# Altium footprint library hphonglib.PcbLib: 703 footprints (part 1 of 44)
Each footprint in its own frame and in the unit in brackets; x right, y up, seen from the top. Pads: shape width x height; smd on the part's side, far side on the other; paste and mask are expansions set on the pad; w line width, h text height; cw(c..) or ccw(c..) is an arc to the next point about the centre after c.
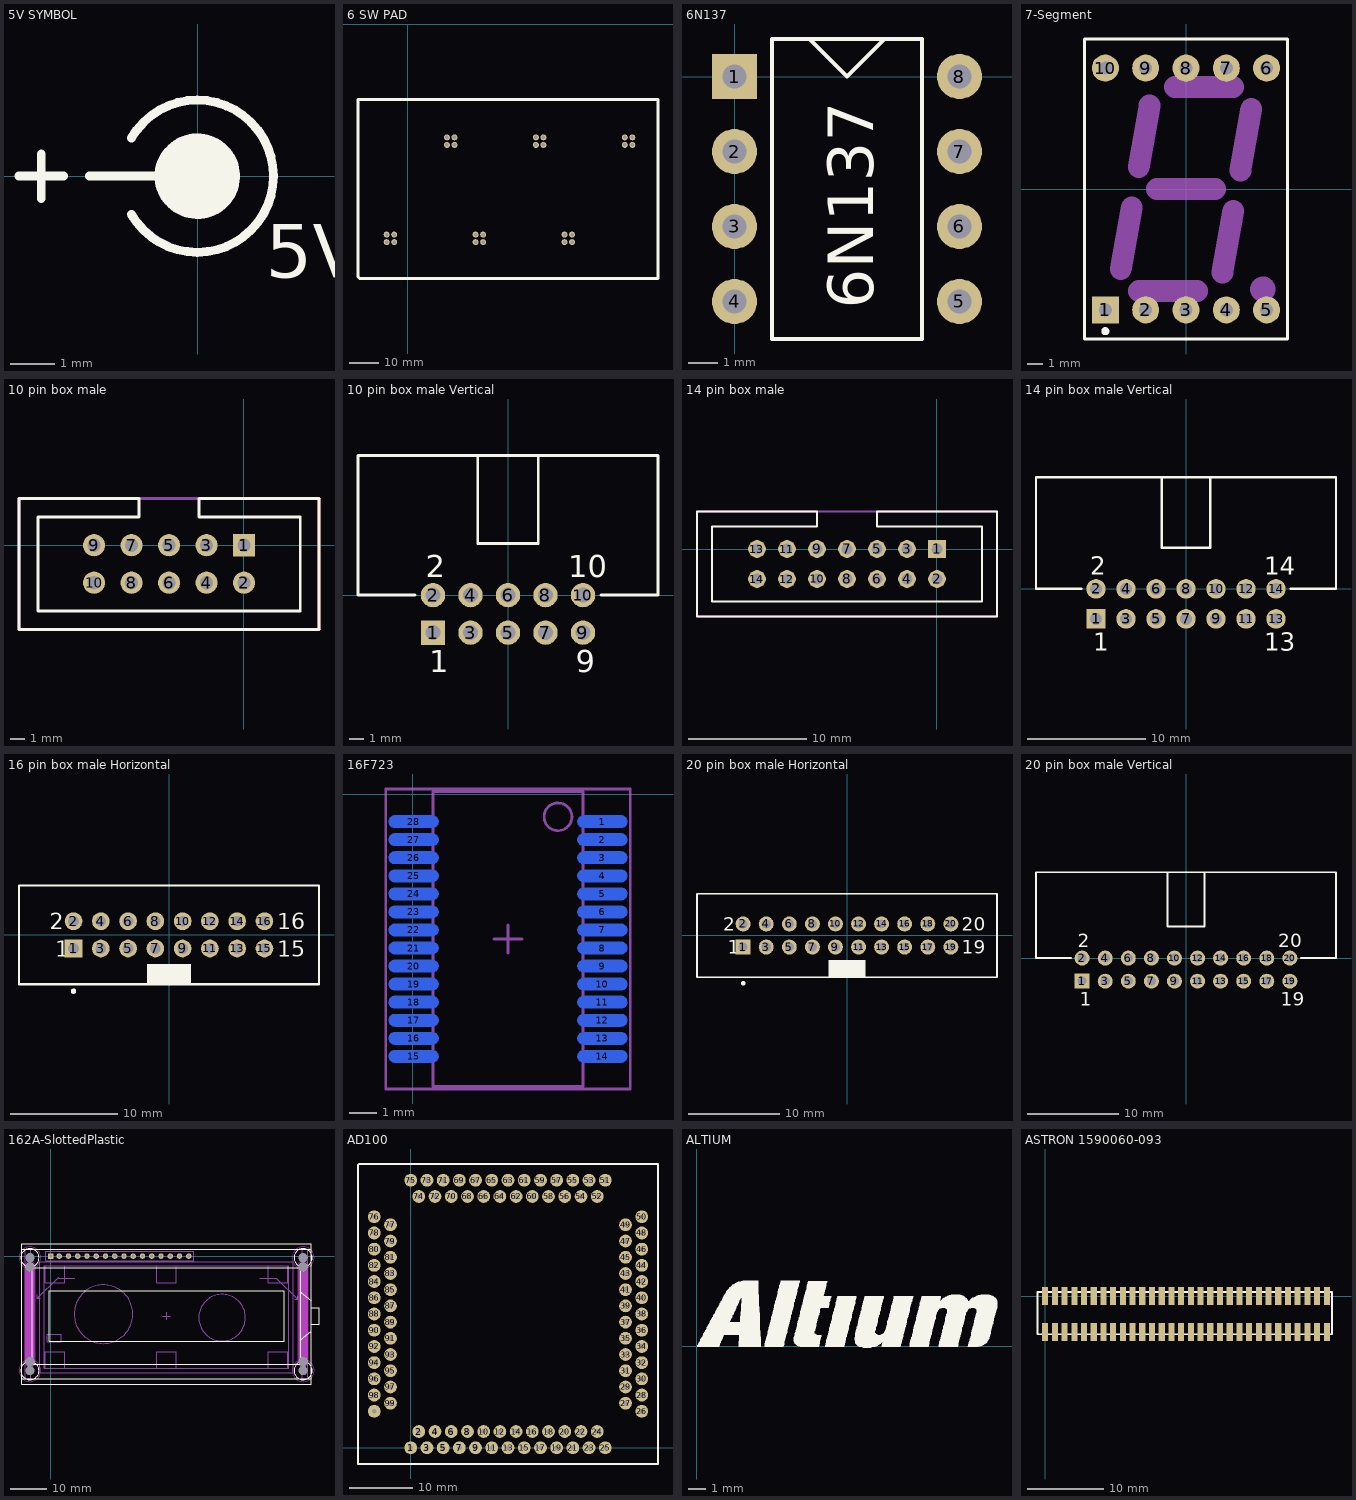
[diagram p0: the footprints below, top view; thin cyan lines are the x and y axes]

## 5V SYMBOL [mm]
Top Overlay:
  circle w1: c-0.007,-0.002 r0.458
  lines w0.2: -4.007,-0.002 -3.007,-0.002 ; -3.507,-0.502 -3.507,0.498 ; -2.423,-0.002 -0.007,-0.002 ; -1.486,-0.856 ccw(c-0.007,-0.002) -1.486,0.853
  text "5V DC" at 1.524,-2.286 h1.2

## 6 SW PAD [mm] "6 switch for 3 phase"
pads (24):
  round 2 hole 1.2: 1(-7.112,-71.12) 2(-4.572,-71.12) 3(22.86,-71.12) 4(25.4,-71.12) 5(52.832,-71.12) 6(55.372,-71.12) 7(13.208,-40.894) 8(15.748,-40.894) 9(43.18,-40.894) 10(45.72,-40.894) 11(73.152,-40.894) 12(75.692,-40.894) 13(-7.112,-73.66) 14(-4.572,-73.66) 15(22.86,-73.66) 16(25.4,-73.66) 17(52.832,-73.66) 18(55.372,-73.66) 19(13.208,-38.354) 20(15.748,-38.354) 21(43.18,-38.354) 22(45.72,-38.354) 23(73.152,-38.354) 24(75.692,-38.354)
Top Overlay:
  lines w1: -16.764,-83.566 -16.764,-25.654 84.328,-25.654 84.328,-85.852 -16.256,-85.852 -16.764,-85.344 -16.764,-83.312

## 6N137 [mil]
pads (8):
  rect 60x60 hole 31.49: 1(0,0)
  round 60 hole 31.49: 2(0,-100) 3(0,-200) 4(0,-300) 5(300,-300) 6(300,-200) 7(300,-100) 8(300,0)
Top Overlay:
  lines w5: 100,50 150,0 200,50 ; 50,-350 50,50 250,50 250,-350 50,-350
  text "6N137" at 185,-310 h60.8

## 7-Segment [mil] "LED, 7-Segment Display, 14.2 mm, RHD; 10 Leads; Row Space 15.24 mm; Pitch 2.54 mm; Solder Pad 35mil"
height 324.8
pads (10):
  rect 67x67 hole 32: 1(-200,-300)
  round 67 hole 32: 2(-100,-300) 3(0,-300) 4(100,-300) 5(200,-300) 6(200,300) 7(100,300) 8(0,300) 9(-100,300) 10(-200,300)
Top Overlay:
  circle w9.84: c-200,-352.64 r4.92
  lines w7.87: -251.97,-372.05 -251.97,372.05 251.97,372.05 251.97,-372.05 -251.97,-372.05
Mechanical 1:
  circle w39.37: c190.63,-248.66 r11.65
  lines w53.94: -161.73,-198.96 -134.86,-46.07 ; -117.1,53.87 -90.29,206.91 ; -116.47,-253.1 27.24,-252.98 ; -71.7,0 71.96,0 ; -27.12,252.95 116.54,252.95 ; 90.35,-206.94 117.34,-53.98 ; 134.92,46.04 161.83,199.13
3D body: height 316.25, standoff -156.19, extent -249.99,-374.99 250.01,375.01

## 10 pin box male [mm]
pads (10):
  rect 1.5x1.5 hole 0.9: 1(0.003,0.004)
  round 1.5 hole 0.9: 2(0.003,-2.536) 3(-2.537,0.004) 4(-2.537,-2.536) 5(-5.077,0.004) 6(-5.077,-2.536) 7(-7.617,0.004) 8(-7.617,-2.536) 9(-10.157,0.004) 10(-10.157,-2.536)
Top Layer:
  lines w0.2: 5.08,-5.715 5.08,3.175
Top Overlay:
  lines w0.2: -7.109,1.909 -7.109,3.179 -15.237,3.179 -15.237,-5.711 5.083,-5.711 5.083,3.179 -3.045,3.179 -3.045,1.909 ; -7.1,1.909 -13.967,1.909 -13.967,-4.441 3.813,-4.441 3.813,1.91 -3.05,1.91
  text "." at 6.223,1.651 h2.54
Mechanical 13:
  lines w0.2: 5.08,-5.715 -15.24,-5.715 -15.24,3.175 5.08,3.175
3D body: height 9.3, standoff -2.5, extent -15.145,-6.224 5.055,3.176

## 10 pin box male Vertical [mm] "Connector; IDC, Low Profile Male Header, Thru-Hole; 10 Position; Right Angle; Pitch 2.54 mm; Body 20.32 x 8.9 x 9.2 mm (LxWxH)"
height 9.2
pads (10):
  rect 1.65x1.65 hole 1: 1(-5.08,-2.54)
  round 1.65 hole 1: 2(-5.08,0) 3(-2.54,-2.54) 4(-2.54,0) 5(0,-2.54) 6(0,0) 7(2.54,-2.54) 8(2.54,0) 9(5.08,-2.54) 10(5.08,0)
Top Overlay:
  lines w0.2: -6.305,0 -10.16,0 -10.16,9.45 10.16,9.45 10.16,0 6.305,0 ; -2.05,9.45 -2.05,3.48 2.05,3.48 2.05,9.45
  text "9" at 4.58,-5.24 h1.5
  text "10" at 4.08,1.2 h1.5
  text "1" at -5.33,-5.24 h1.5
  text "2" at -5.58,1.2 h1.5

## 14 pin box male [mm]
pads (14):
  rect 1.5x1.5 hole 0.9: 1(0.003,0.004)
  round 1.5 hole 0.9: 2(0.003,-2.536) 3(-2.537,0.004) 4(-2.537,-2.536) 5(-5.077,0.004) 6(-5.077,-2.536) 7(-7.617,0.004) 8(-7.617,-2.536) 9(-10.157,0.004) 10(-10.157,-2.536) 11(-12.7,0) 12(-12.7,-2.54) 13(-15.24,0) 14(-15.24,-2.54)
Top Overlay:
  lines w0.2: -20.32,-5.711 5.083,-5.711 5.083,3.179 -5.08,3.179 -5.08,1.91 3.813,1.91 3.813,-4.441 -19.05,-4.441 -19.05,1.909 -10.16,1.909 -10.16,3.179 -20.32,3.179 -20.32,-5.711
  text "." at 6.604,1.524 h2.54
Mechanical 13:
  lines w0.2: -20.32,-5.715 -20.32,3.175 5.08,3.175 5.08,-5.715 -20.32,-5.715
3D body: height 9.3, standoff -2.5, extent -20.311,-6.123 4.969,3.277

## 14 pin box male Vertical [mm] "Connector; IDC, Low Profile Male Header, Thru-Hole; 14 Position; Right Angle; Pitch 2.54 mm; Body 25.40 x 8.9 x 9.2 mm (LxWxH)"
height 9.2
pads (14):
  rect 1.65x1.65 hole 1: 1(-7.62,-2.54)
  round 1.65 hole 1: 2(-7.62,0) 3(-5.08,-2.54) 4(-5.08,0) 5(-2.54,-2.54) 6(-2.54,0) 7(0,-2.54) 8(0,0) 9(2.54,-2.54) 10(2.54,0) 11(5.08,-2.54) 12(5.08,0) 13(7.62,-2.54) 14(7.62,0)
Top Overlay:
  lines w0.2: -8.845,0 -12.7,0 -12.7,9.45 12.7,9.45 12.7,0 8.845,0 ; -2.05,9.45 -2.05,3.48 2.05,3.48 2.05,9.45
  text "2" at -8.12,1.2 h1.5
  text "1" at -7.87,-5.24 h1.5
  text "14" at 6.62,1.2 h1.5
  text "13" at 6.62,-5.24 h1.5
3D body: height 6.6, standoff 5.84, extent -8.02,-2.54 -7.22,9.021
3D body: height 6.6, standoff 5.84, extent -5.48,-2.54 -4.68,9.021
3D body: height 6.6, standoff 5.84, extent -2.94,-2.54 -2.14,9.021
3D body: height 6.6, standoff 5.84, extent -0.4,-2.54 0.4,9.021
3D body: height 6.6, standoff 5.84, extent 2.14,-2.54 2.94,9.021
3D body: height 6.6, standoff 5.84, extent 4.68,-2.54 5.48,9.021
3D body: height 4.06, standoff 3.3, extent -8.02,0 -7.22,9.021
3D body: height 4.06, standoff 3.3, extent -5.48,0 -4.68,9.021
3D body: height 4.06, standoff 3.3, extent -2.94,0 -2.14,9.021
3D body: height 4.06, standoff 3.3, extent -0.4,0 0.4,9.021
3D body: height 4.06, standoff 3.3, extent 2.14,0 2.94,9.021
3D body: height 4.06, standoff 3.3, extent 4.68,0 5.48,9.021
3D body: height 4.06, standoff 3.3, extent 7.2,0 8,9.021
3D body: height 9.4, standoff 1.27, extent -12.732,1.182 -11.432,9.183
3D body: height 9.4, standoff 0.51, extent 11.368,1.182 12.668,9.183
3D body: height 9.4, standoff 1.27, extent -12.732,1.182 12.668,2.382
3D body: height 9.4, standoff 8.13, extent -12.728,1.182 12.668,9.271
3D body: height 1.78, standoff 0.51, extent -12.732,1.182 12.668,9.271
3D body: height 6.6, standoff 5.84, extent 7.2,-2.54 8,9.021

## 16 pin box male Horizontal [mm] "Connector; IDC, Low Profile Male Header, Thru-Hole; 16 Position; Vertical; Pitch 2.54 mm; Body 27.94 x 9.2 x 9.45 mm (LxWxH)"
height 9.45
pads (16):
  rect 1.65x1.65 hole 1: 1(-8.89,-1.27)
  round 1.65 hole 1: 2(-8.89,1.27) 3(-6.35,-1.27) 4(-6.35,1.27) 5(-3.81,-1.27) 6(-3.81,1.27) 7(-1.27,-1.27) 8(-1.27,1.27) 9(1.27,-1.27) 10(1.27,1.27) 11(3.81,-1.27) 12(3.81,1.27) 13(6.35,-1.27) 14(6.35,1.27) 15(8.89,-1.27) 16(8.89,1.27)
Top Overlay:
  circle w0.25: c-8.89,-5.25 r0.125
  rectangle: -2.05,-4.6 2.05,-2.7
  lines w0.2: -13.97,-4.6 13.97,-4.6 13.97,4.6 -13.97,4.6 -13.97,-4.6
  text "15" at 10.09,-2.02 h1.5
  text "16" at 10.09,0.52 h1.5
  text "1" at -10.59,-2.02 h1.5
  text "2" at -11.09,0.52 h1.5

## 16F723 [mm]
pads (28):
  oval 1.8x0.45 smd far side: 1(6.829,-0.982) 2(6.829,-1.632) 3(6.829,-2.282) 4(6.829,-2.932) 5(6.829,-3.582) 6(6.829,-4.232) 7(6.829,-4.882) 8(6.829,-5.532) 9(6.829,-6.182) 10(6.829,-6.832) 11(6.829,-7.482) 12(6.829,-8.132) 13(6.829,-8.782) 14(6.829,-9.432) 15(0.029,-9.432) 16(0.029,-8.782) 17(0.029,-8.132) 18(0.029,-7.482) 19(0.029,-6.832) 20(0.029,-6.182) 21(0.029,-5.532) 22(0.029,-4.882) 23(0.029,-4.232) 24(0.029,-3.582) 25(0.029,-2.932) 26(0.029,-2.282) 27(0.029,-1.632) 28(0.029,-0.982)
Bottom Overlay:
  circle w0.6: c4.529,-0.907 r0.3
  circle w0.25: c6.829,-0.207 r0.125
  lines w0.2: 1.329,-10.507 5.529,-10.507 5.529,0.093 1.329,0.093 1.329,-10.507
Mechanical 13:
  circle w0.1: c5.229,-0.807 r0.5
  lines w0.1: 0.729,-10.507 6.129,-10.507 6.129,0.093 0.729,0.093 0.729,-10.507
Mechanical 15:
  lines w0.1: 2.929,-5.207 3.929,-5.207 ; 3.429,-5.707 3.429,-4.707 ; -0.971,-10.607 7.829,-10.607 7.829,0.193 -0.971,0.193 -0.971,-10.607
3D body: height 2, standoff 0, extent 0.729,-10.507 6.129,0.093

## 20 pin box male Horizontal [mm] "Connector; IDC, Low Profile Male Header, Thru-Hole; 20 Position; Vertical; Pitch 2.54 mm; Body 33.02 x 9.2 x 9.45 mm (LxWxH)"
height 9.45
pads (20):
  rect 1.65x1.65 hole 1: 1(-11.43,-1.27)
  round 1.65 hole 1: 2(-11.43,1.27) 3(-8.89,-1.27) 4(-8.89,1.27) 5(-6.35,-1.27) 6(-6.35,1.27) 7(-3.81,-1.27) 8(-3.81,1.27) 9(-1.27,-1.27) 10(-1.27,1.27) 11(1.27,-1.27) 12(1.27,1.27) 13(3.81,-1.27) 14(3.81,1.27) 15(6.35,-1.27) 16(6.35,1.27) 17(8.89,-1.27) 18(8.89,1.27) 19(11.43,-1.27) 20(11.43,1.27)
Top Overlay:
  circle w0.25: c-11.43,-5.25 r0.125
  rectangle: -2.05,-4.6 2.05,-2.7
  lines w0.2: -16.51,-4.6 -16.51,4.6 16.51,4.6 16.51,-4.6 -16.51,-4.6
  text "2" at -13.63,0.52 h1.5
  text "1" at -13.13,-2.02 h1.5
  text "20" at 12.63,0.52 h1.5
  text "19" at 12.63,-2.02 h1.5
3D body: height 8.8, standoff -3, extent -16.434,-4.599 16.466,4.801

## 20 pin box male Vertical [mm] "Connector; IDC, Low Profile Male Header, Thru-Hole; 20 Position; Right Angle; Pitch 2.54 mm; Body 33.02 x 8.9 x 9.2 mm (LxWxH)"
height 9.2
pads (20):
  rect 1.65x1.65 hole 1: 1(-11.43,-2.54)
  round 1.65 hole 1: 2(-11.43,0) 3(-8.89,-2.54) 4(-8.89,0) 5(-6.35,-2.54) 6(-6.35,0) 7(-3.81,-2.54) 8(-3.81,0) 9(-1.27,-2.54) 10(-1.27,0) 11(1.27,-2.54) 12(1.27,0) 13(3.81,-2.54) 14(3.81,0) 15(6.35,-2.54) 16(6.35,0) 17(8.89,-2.54) 18(8.89,0) 19(11.43,-2.54) 20(11.43,0)
Top Overlay:
  lines w0.2: -12.655,0 -16.51,0 -16.51,9.45 16.51,9.45 16.51,0 12.655,0 ; -2.05,9.45 -2.05,3.48 2.05,3.48 2.05,9.45
  text "19" at 10.43,-5.24 h1.5
  text "20" at 10.18,1.2 h1.5
  text "1" at -11.68,-5.24 h1.5
  text "2" at -11.93,1.2 h1.5

## 162A-SlottedPlastic [mm] "LCD and Mounting Moulding"
height 18.58
pads (25):
  rect 1.5x1.5 / inner rect 1.5x1.5 / far side rect 1.7x1.7 hole 0.9: 1(0,0)
  round 1.5 / inner round 1.5 / far side round 1.7 hole 0.9: 2(2.29,0) 3(4.83,0) 4(7.37,0) 5(9.91,0) 6(12.45,0) 7(14.99,0) 8(17.53,0) 9(20.07,0) 10(22.61,0) 11(25.15,0) 12(27.69,0) 13(30.23,0) 14(32.77,0) 15(35.31,0) 16(37.85,0)
  round 2.3 hole 2.5 unplated: M1(-5.75,-0.45) M2(69.25,-0.45) M2(69.25,-0.45) M3(-5.75,-31.45) M4(69.25,-31.45)
  round 2.4 hole 2.5 unplated: S1_1(-5.75,-3) S1_2(-5.75,-28.9) S2_1(69.25,-3) S2_2(69.25,-28.9)
Top Overlay:
  circle w0.2: c-5.75,-0.45 r2.5
  circle w0.2: c69.25,-0.45 r2.5
  circle w0.2: c69.25,-31.45 r2.5
  circle w0.2: c-5.75,-31.45 r2.5
  lines w0.2: 68.55,-22.95 71.5,-20.65 ; 68.55,-9.95 71.5,-12.25 ; 71.5,-18.75 73.6,-18.75 73.6,-14.15 71.5,-14.15 ; -8,-33.65 -8,1.85 ; -8,-33.65 71.5,-33.65 ; -8,-33.65 -8,-35.2 71.5,-35.2 71.5,-33.65 ; -8,1.85 71.5,1.85 ; -8,1.85 -8,3.4 71.5,3.4 71.5,1.85 ; 71.5,-33.65 71.5,1.85 ; -5.05,-29.75 68.55,-29.75 68.55,-3.15 -5.05,-3.15 -5.05,-29.75 ; -0.5,-23.35 -0.5,-9.55 64,-9.55 64,-23.35 -0.5,-23.35
Bottom Overlay:
  circle w0.2: c-5.75,-0.45 r2.5
  circle w0.2: c69.25,-0.45 r2.5
  circle w0.2: c69.25,-31.45 r2.5
  circle w0.2: c-5.75,-31.45 r2.5
Keep-Out Layer:
  circle w0.2: c-5.75,-0.45 r3
  circle w0.2: c-5.75,-31.45 r3
  circle w0.2: c69.25,-31.45 r3
  circle w0.2: c69.25,-0.45 r3
  lines w3: -5.75,-29.15 -5.75,-2.75 ; 69.25,-29.15 69.25,-2.75
Mechanical 1:
  lines w0.2: 30.75,-16.45 32.75,-16.45 ; 31.75,-17.45 31.75,-15.45
Mechanical 3:
  lines w0.2: -3.7,-10.65 -3.7,-11.55 ; -2.9,-11.55 -3.7,-11.55 ; 2.1,-6.05 6.6,-6.05 ; 2.1,-5.75 -3.7,-11.55 ; 57.3,-6.05 61.9,-6.05 67.7,-11.85 ; 66.9,-11.85 67.7,-11.85 ; 67.7,-10.95 67.7,-11.85
  lines w2.5: -5.75,-28.9 -5.75,-3 ; 69.25,-28.9 69.25,-3
  text "Two non-plated slots 2.5mm wide from hole to hole" at 8.3,-6.35 h1
Mechanical 4:
  circle w0.1: c47,-16.9 r6.4
  circle w0.1: c14.45,-15.95 r8.05
  lines w0.1: -7,-33.65 -5.5,-33.65 -5.5,1.85 -7,1.85 -7,-33.65 ; -3,-32 -3,-1.5 66.5,-1.5 66.5,-32 -3,-32 ; -1.8,-30.8 65.3,-30.8 65.3,-2.7 -1.8,-2.7 -1.8,-30.8 ; -1.55,-30.8 -1.55,-26.2 3.85,-26.2 3.85,-30.8 -1.55,-30.8 ; -1.55,-7.3 -1.55,-2.7 3.85,-2.7 3.85,-7.3 -1.55,-7.3 ; -1.4,-1.3 39.2,-1.3 39.2,1.3 -1.4,1.3 -1.4,-1.3 ; -1,-23.5 2.9,-23.5 2.9,-21.4 -1,-21.4 -1,-23.5 ; 29.05,-30.8 29.05,-26.2 34.45,-26.2 34.45,-30.8 29.05,-30.8 ; 29.05,-7.3 34.45,-7.3 34.45,-2.7 29.05,-2.7 29.05,-7.3 ; 59.65,-30.8 59.65,-26.2 65.05,-26.2 65.05,-30.8 59.65,-30.8 ; 59.65,-7.3 59.65,-2.7 65.05,-2.7 65.05,-7.3 59.65,-7.3 ; 69,-33.65 69,1.85 70.5,1.85 70.5,-33.65 69,-33.65
3D body: height 18.9, standoff 10.6, extent -5.05,-29.75 68.55,-3.15
3D body: height 13, standoff 9, extent -8,1.85 1.65,3.4
3D body: height 13, standoff 9, extent -8,-35.2 1.65,-33.65
3D body: height 13, standoff 9, extent 62.75,-35.2 72.4,-33.65
3D body: height 13, standoff 9, extent 61.85,1.85 71.5,3.4
3D body: height 10.7, standoff 9, extent 1.65,1.85 61.85,3.4
3D body: height 10.7, standoff 9, extent 1.65,-35.2 61.85,-33.65
3D body: height 18.95, standoff 18.9, extent -5.05,-29.75 31.75,-3.15
3D body: height 18.95, standoff 18.9, extent 31.75,-29.75 68.55,-3.15
3D body: height 13.3, standoff 7.3, extent 71.501,-18.749 73.599,-14.151
3D body: height 10.6, standoff 9, extent -8,-33.65 71.5,1.85
3D body: height 14.1, standoff 10.6, extent 68.55,-22.95 71.5,-9.95
3D body: height 9, standoff 6.7, extent -3,-35.2 66.5,-32
3D body: height 9, standoff 0, extent 69,-33.65 70.5,1.85
3D body: height 9, standoff 0, extent -7,-33.65 -5.5,1.85
3D body: height 9, standoff 0, extent -1.4,-1.3 39.2,1.3
3D body: height 9, standoff 8.3, extent -1,-23.5 2.9,-21.4
3D body: height 9, standoff 5.3, extent 65.3,-30.8 66.5,-2.7
3D body: height 9, standoff 5.3, extent -3,-30.8 -1.8,-2.7
3D body: height 9, standoff 5.3, extent -3,-32 66.5,-30.75
3D body: height 9, standoff 5.3, extent -3,-2.7 66.5,-1.5
3D body: height 9, standoff 7, extent 29.05,-30.8 34.45,-26.2
3D body: height 9, standoff 7, extent -1.55,-30.8 3.85,-26.2
3D body: height 9, standoff 7, extent -1.55,-7.3 3.85,-2.7
3D body: height 9, standoff 7, extent 59.65,-7.3 65.05,-2.7
3D body: height 9, standoff 7, extent 59.65,-30.8 65.05,-26.2
3D body: height 9, standoff 8, extent 6.399,-24.001 22.501,-7.899
3D body: height 9, standoff 6.7, extent -8,-35.2 -3,3.4
3D body: height 9, standoff 6.7, extent -3,-1.5 66.5,3.4
3D body: height 9, standoff 6.7, extent -1.4,-1.5 39.2,-1.3
3D body: height 9, standoff 6.7, extent 66.5,-35.2 71.5,3.4
3D body: height 9, standoff 7, extent 29.05,-7.3 34.45,-2.7
3D body: height 9, standoff 8, extent 40.599,-23.301 53.401,-10.499

## AD100 [mm] "adapter 100pin for dspic33"
pads (100):
  round 2 hole 0.762: 1(0,0) 2(1.27,2.54) 3(2.54,0) 4(3.81,2.54) 5(5.08,0) 6(6.35,2.54) 7(7.62,0) 8(8.89,2.54) 9(10.16,0) 10(11.43,2.54) 11(12.7,0) 12(13.97,2.54) 13(15.24,0) 14(16.51,2.54) 15(17.78,0) 16(19.05,2.54) 17(20.32,0) 18(21.59,2.54) 19(22.86,0) 20(24.13,2.54) 21(25.4,0) 22(26.67,2.54) 23(27.94,0) 24(29.21,2.54) 25(30.48,0) 26(36.195,5.715) 27(33.655,6.985) 28(36.195,8.255) 29(33.655,9.525) 30(36.195,10.795) 31(33.655,12.065) 32(36.195,13.335) 33(33.655,14.605) 34(36.195,15.875) 35(33.655,17.145) 36(36.195,18.415) 37(33.655,19.685) 38(36.195,20.955) 39(33.655,22.225) 40(36.195,23.495) 41(33.655,24.765) 42(36.195,26.035) 43(33.655,27.305) 44(36.195,28.575) 45(33.655,29.845) 46(36.195,31.115) 47(33.655,32.385) 48(36.195,33.655) 49(33.655,34.925) 50(36.195,36.195) 51(30.48,41.91) 52(29.21,39.37) 53(27.94,41.91) 54(26.67,39.37) 55(25.4,41.91) 56(24.13,39.37) 57(22.86,41.91) 58(21.59,39.37) 59(20.32,41.91) 60(19.05,39.37) 61(17.78,41.91) 62(16.51,39.37) 63(15.24,41.91) 64(13.97,39.37) 65(12.7,41.91) 66(11.43,39.37) 67(10.16,41.91) 68(8.89,39.37) 69(7.62,41.91) 70(6.35,39.37) 71(5.08,41.91) 72(3.81,39.37) 73(2.54,41.91) 74(1.27,39.37) 75(0,41.91) 76(-5.715,36.195) 77(-3.175,34.925) 78(-5.715,33.655) 79(-3.175,32.385) 80(-5.715,31.115) 81(-3.175,29.845) 82(-5.715,28.575) 83(-3.175,27.305) 84(-5.715,26.035) 85(-3.175,24.765) 86(-5.715,23.495) 87(-3.175,22.225) 88(-5.715,20.955) 89(-3.175,19.685) 90(-5.715,18.415) 91(-3.175,17.145) 92(-5.715,15.875) 93(-3.175,14.605) 94(-5.715,13.335) 95(-3.175,12.065) 96(-5.715,10.795) 97(-3.175,9.525) 98(-5.715,8.255) 99(-3.175,6.985) 100(-5.715,5.715)
Top Overlay:
  lines w0.254: -8.255,-2.54 -8.255,44.323 -8.128,44.45 38.735,44.45 38.735,-2.54 -8.255,-2.54

## ALTIUM [mm]
Top Overlay:
  drawing of 1207 lines, arcs and shapes, not listed

## ASTRON 1590060-093 [mm]
pads (60):
  rect 0.8x2.4 smd: 1(0,-4.7) 2(0,0) 3(1.27,-4.7) 4(1.27,0) 5(2.54,-4.7) 6(2.54,0) 7(3.81,-4.7) 8(3.81,0) 9(5.08,-4.7) 10(5.08,0) 11(6.35,-4.7) 12(6.35,0) 13(7.62,-4.7) 14(7.62,0) 15(8.89,-4.7) 16(8.89,0) 17(10.16,-4.7) 18(10.16,0) 19(11.43,-4.7) 20(11.43,0) 21(12.7,-4.7) 22(12.7,0) 23(13.97,-4.7) 24(13.97,0) 25(15.24,-4.7) 26(15.24,0) 27(16.51,-4.7) 28(16.51,0) 29(17.78,-4.7) 30(17.78,0) 31(19.05,-4.7) 32(19.05,0) 33(20.32,-4.7) 34(20.32,0) 35(21.59,-4.7) 36(21.59,0) 37(22.86,-4.7) 38(22.86,0) 39(24.13,-4.7) 40(24.13,0) 41(25.4,-4.7) 42(25.4,0) 43(26.67,-4.7) 44(26.67,0) 45(27.94,-4.7) 46(27.94,0) 47(29.21,-4.7) 48(29.21,0) 49(30.48,-4.7) 50(30.48,0) 51(31.75,-4.7) 52(31.75,0) 53(33.02,-4.7) 54(33.02,0) 55(34.29,-4.7) 56(34.29,0) 57(35.56,-4.7) 58(35.56,0) 59(36.83,-4.7) 60(36.83,0)
Top Overlay:
  lines w0.254: -1,-5 -1,0.5 37.5,0.5 37.5,-5 -1,-5